# Altium integrated library CbyP.IntLib: 1144 symbols (part 5 of 6) (continued)
## STM32F411RET6 (continued)
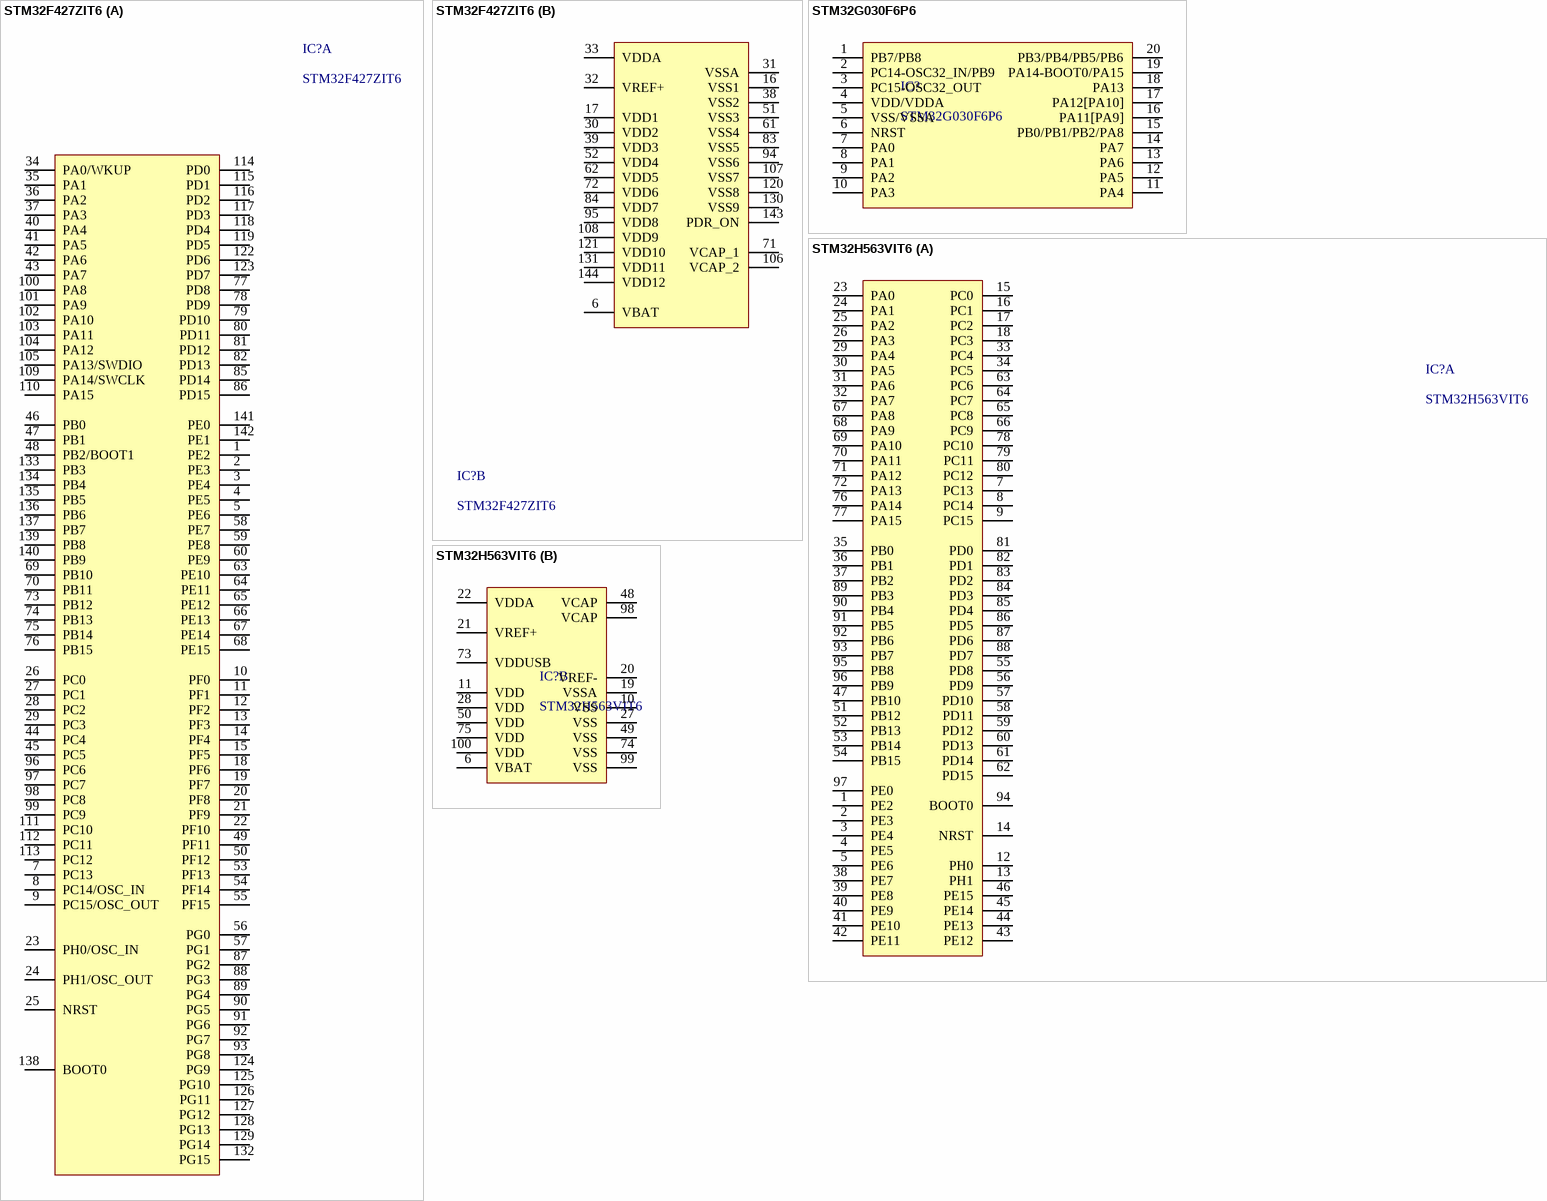
[diagram p32: symbols STM32F427ZIT6 to STM32H563VIT6]

## STM32F427ZIT6
designator IC?
2MB 1.8V~3.6V ARM-M4 256KB 180MHz FLASH 114 LQFP-144(20x20) Microcontrollers (MCU/MPU/SOC) ROHS; Manufacturer: STMicroelectronics; So_Chan_Dan: 144; So_Chan_Cam: 0; Package: LQFP-64(10x10); Mfr.Part #: STM32F427ZIT6; Name: STM32F427ZIT6
footprint LQFP-144(20x20)
part A pins: 1 PE2, 2 PE3, 3 PE4, 4 PE5, 5 PE6, 7 PC13, 8 PC14/OSC_IN, 9 PC15/OSC_OUT, 10 PF0, 11 PF1, 12 PF2, 13 PF3, 14 PF4, 15 PF5, 18 PF6, 19 PF7, 20 PF8, 21 PF9, 22 PF10, 23 PH0/OSC_IN, 24 PH1/OSC_OUT, 25 NRST, 26 PC0, 27 PC1, 28 PC2, 29 PC3, 34 PA0/WKUP, 35 PA1, 36 PA2, 37 PA3, 40 PA4, 41 PA5, 42 PA6, 43 PA7, 44 PC4, 45 PC5, 46 PB0, 47 PB1, 48 PB2/BOOT1, 49 PF11, 50 PF12, 53 PF13, 54 PF14, 55 PF15, 56 PG0, 57 PG1, 58 PE7, 59 PE8, 60 PE9, 63 PE10, 64 PE11, 65 PE12, 66 PE13, 67 PE14, 68 PE15, 69 PB10, 70 PB11, 73 PB12, 74 PB13, 75 PB14, 76 PB15, 77 PD8, 78 PD9, 79 PD10, 80 PD11, 81 PD12, 82 PD13, 85 PD14, 86 PD15, 87 PG2, 88 PG3, 89 PG4, 90 PG5, 91 PG6, 92 PG7, 93 PG8, 96 PC6, 97 PC7, 98 PC8, 99 PC9, 100 PA8, 101 PA9, 102 PA10, 103 PA11, 104 PA12, 105 PA13/SWDIO, 109 PA14/SWCLK, 110 PA15, 111 PC10, 112 PC11, 113 PC12, 114 PD0, 115 PD1, 116 PD2, 117 PD3, 118 PD4, 119 PD5, 122 PD6, 123 PD7, 124 PG9, 125 PG10, 126 PG11, 127 PG12, 128 PG13, 129 PG14, 132 PG15, 133 PB3, 134 PB4, 135 PB5, 136 PB6, 137 PB7, 138 BOOT0, 139 PB8, 140 PB9, 141 PE0, 142 PE1
part B pins: 6 VBAT, 16 VSS1, 17 VDD1, 30 VDD2, 31 VSSA, 32 VREF+, 33 VDDA, 38 VSS2, 39 VDD3, 51 VSS3, 52 VDD4, 61 VSS4, 62 VDD5, 71 VCAP_1, 72 VDD6, 83 VSS5, 84 VDD7, 94 VSS6, 95 VDD8, 106 VCAP_2, 107 VSS7, 108 VDD9, 120 VSS8, 121 VDD10, 130 VSS9, 131 VDD11, 143 PDR_ON, 144 VDD12

## STM32G030F6P6
designator IC?
ARM-M0 64MHz 18 TSSOP-20 Microcontrollers ROHS; Manufacturer: ST; So_Chna_Cam: 0; Mfr.Part #: STM32G030F6P6; Package: TSSOP-20; LCSC Part #: C724040; DigiKey Part Number: 497-STM32G030F6P6-ND; Link: https://www.lcsc.com/product-detail/Audio-Amplifiers_Jiaxing-Heroic-Elec-Tech-HT6818_C130782.html
footprint QSOP-24
pins: 1 PB7/PB8, 2 PC14-OSC32_IN/PB9, 3 PC15-OSC32_OUT, 4 VDD/VDDA, 5 VSS/VSSA, 6 NRST, 7 PA0, 8 PA1, 9 PA2, 10 PA3, 11 PA4, 12 PA5, 13 PA6, 14 PA7, 15 PB0/PB1/PB2/PA8, 16 PA11[PA9], 17 PA12[PA10], 18 PA13, 19 PA14-BOOT0/PA15, 20 PB3/PB4/PB5/PB6

## STM32H563VIT6
designator IC?
LQFP-100(14x14) Microcontrollers RoHS; Manufacturer: ST; Mfr.Part #: STM32H563VIT6; Package: LQFP-100(14x14); LCSC Part #: C6937834; DigiKey Part Number: 497-STM32H563VIT6-ND
footprint LQFP-100(14x14)
part A pins: 1 PE2, 2 PE3, 3 PE4, 4 PE5, 5 PE6, 7 PC13, 8 PC14, 9 PC15, 12 PH0, 13 PH1, 14 NRST, 15 PC0, 16 PC1, 17 PC2, 18 PC3, 23 PA0, 24 PA1, 25 PA2, 26 PA3 (power), 29 PA4, 30 PA5, 31 PA6, 32 PA7, 33 PC4, 34 PC5, 35 PB0, 36 PB1, 37 PB2, 38 PE7, 39 PE8, 40 PE9, 41 PE10, 42 PE11, 43 PE12, 44 PE13, 45 PE14, 46 PE15, 47 PB10, 51 PB12, 52 PB13, 53 PB14, 54 PB15, 55 PD8, 56 PD9, 57 PD10, 58 PD11, 59 PD12, 60 PD13, 61 PD14, 62 PD15, 63 PC6, 64 PC7, 65 PC8, 66 PC9, 67 PA8, 68 PA9, 69 PA10, 70 PA11, 71 PA12, 72 PA13, 76 PA14, 77 PA15, 78 PC10, 79 PC11, 80 PC12, 81 PD0, 82 PD1, 83 PD2, 84 PD3, 85 PD4, 86 PD5, 87 PD6, 88 PD7, 89 PB3, 90 PB4, 91 PB5, 92 PB6, 93 PB7, 94 BOOT0, 95 PB8, 96 PB9, 97 PE0
part B pins: 6 VBAT (power), 10 VSS (power), 11 VDD (power), 19 VSSA (power), 20 VREF- (power), 21 VREF+ (power), 22 VDDA, 27 VSS (power), 28 VDD, 48 VCAP (power), 49 VSS (power), 50 VDD (power), 73 VDDUSB (power), 74 VSS (power), 75 VDD (power), 98 VCAP, 99 VSS (power), 100 VDD (power)

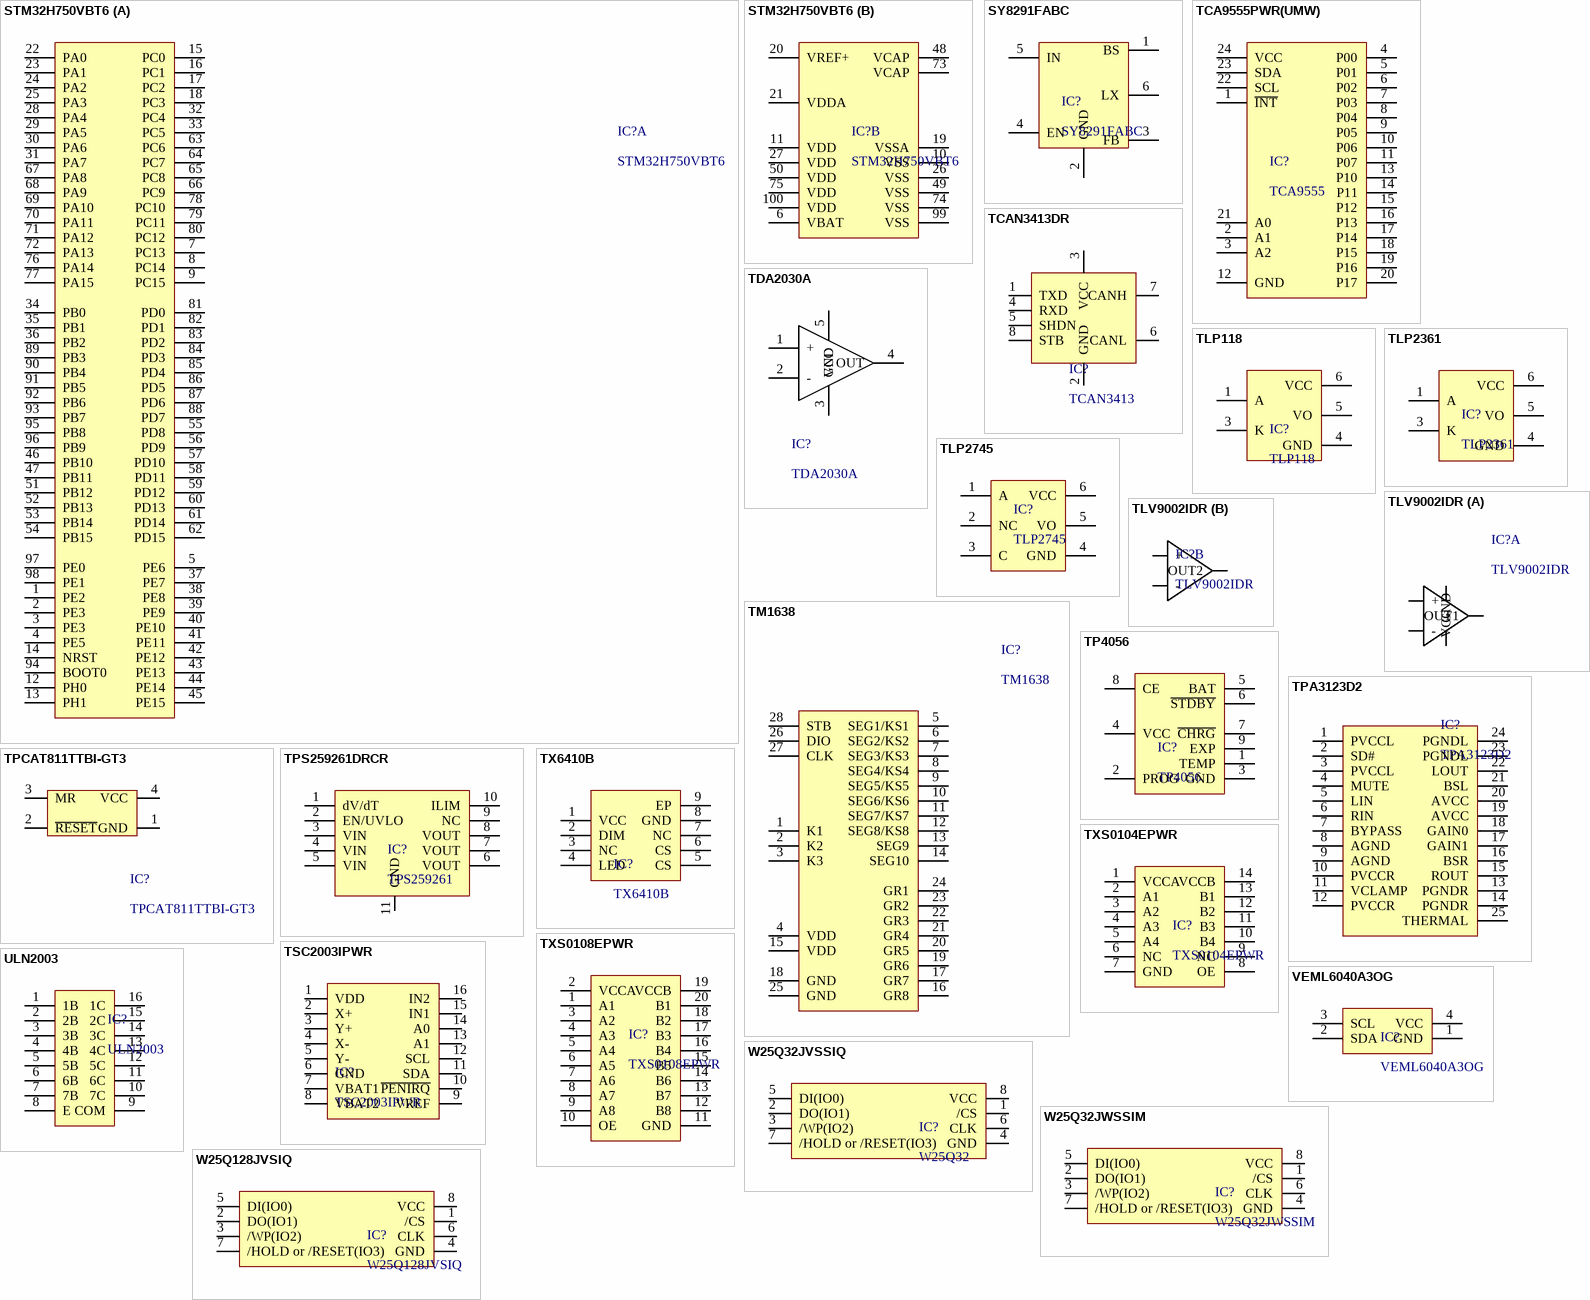
[diagram p33: symbols STM32H750VBT6 to W25Q128JVSIQ]

## STM32H750VBT6
designator IC?
ARM-MSeries LQFP-100(14x14) Microcontrollers (MCU/MPU/SOC) ROHS; Manufacturer: STMicroelectronics; So_Chan_Dan: 100; So_Chan_Cam: 0; Mfr.Part #: STM32H750VBT6; Package: LQFP-100(14x14); Name: STM32H750VBT6
footprint LQFP-100(14x14)
part A pins: 1 PE2, 2 PE3, 3 PE3, 4 PE5, 5 PE6, 7 PC13, 8 PC14, 9 PC15, 12 PH0, 13 PH1, 14 NRST, 15 PC0, 16 PC1, 17 PC2, 18 PC3, 22 PA0, 23 PA1, 24 PA2, 25 PA3, 28 PA4, 29 PA5, 30 PA6, 31 PA7, 32 PC4, 33 PC5, 34 PB0, 35 PB1, 36 PB2, 37 PE7, 38 PE8, 39 PE9, 40 PE10, 41 PE11, 42 PE12, 43 PE13, 44 PE14, 45 PE15, 46 PB10, 47 PB11, 51 PB12, 52 PB13, 53 PB14, 54 PB15, 55 PD8, 56 PD9, 57 PD10, 58 PD11, 59 PD12, 60 PD13, 61 PD14, 62 PD15, 63 PC6, 64 PC7, 65 PC8, 66 PC9, 67 PA8, 68 PA9, 69 PA10, 70 PA11, 71 PA12, 72 PA13, 76 PA14, 77 PA15, 78 PC10, 79 PC11, 80 PC12, 81 PD0, 82 PD1, 83 PD2, 84 PD3, 85 PD4, 86 PD5, 87 PD6, 88 PD7, 89 PB3, 90 PB4, 91 PB5, 92 PB6, 93 PB7, 94 BOOT0, 95 PB8, 96 PB9, 97 PE0, 98 PE1
part B pins: 6 VBAT (power), 10 VSS (power), 11 VDD (power), 19 VSSA (power), 20 VREF+ (power), 21 VDDA (power), 26 VSS (power), 27 VDD (power), 48 VCAP (power), 49 VSS (power), 50 VDD (power), 73 VCAP (power), 74 VSS (power), 75 VDD (power), 99 VSS (power), 100 VDD (power)

## SY8291FABC
designator IC?
Lithium-ion/Polymer 1 SOT23-6 Battery Management ROHS; Manufacturer: Silergy Corp; So_Chan_Dan: 6; So_Chan_Cam: 0; Package: SOT23-6; Name: SY8291FABC; Mfr.Part #: SY8291FABC
footprint SOT23-6
pins: 1 BS, 2 GND, 3 FB (power), 4 EN (power), 5 IN (power), 6 LX

## TCA9555PWR(UMW)
designator IC?, comment TCA9555
16 I2C TSSOP-24 I/O Expanders RoHS; Manufacturer: UMW; Mfr.Part #: TCA9555PWR(UMW); Package: TSSOP-24; LCSC Part #: C42420608; DigiKey Part Number: NO; ComponentLink1Description: Link; ComponentLink1URL: https://www.lcsc.com/product-detail/C42420608.html?s_z=n_TCA9555PWR%28UMW%29; ComponentLink2Description: Link 1
footprint TSSOP-24
pins: 1 ~{INT}, 2 A1, 3 A2, 4 P00, 5 P01, 6 P02, 7 P03, 8 P04, 9 P05, 10 P06, 11 P07, 12 GND, 13 P10, 14 P11, 15 P12, 16 P13, 17 P14, 18 P15, 19 P16, 20 P17, 21 A0, 22 SCL, 23 SDA, 24 VCC

## TCAN3413DR
designator IC?, comment TCAN3413
5Mbps CAN FD Transceiver SOIC-8 CAN Transceivers ROHS; Manufacturer: Texas Instruments; Mfr.Part #: TCAN3413DR; Package: SOIC-8; LCSC Part #: C22433320
footprint SOIC-8
pins: 1 TXD, 2 GND, 3 VCC "VH/RH", 4 RXD, 5 SHDN, 6 CANL, 7 CANH, 8 STB

## TDA2030A
designator IC?
Monaural 12Wx1@8Ω AB Class Amplifier TO-220B Audio Amplifiers ROHS; Manufacturer: UTC(Unisonic Tech); Mfr.Part #: TDA2030AL-TB5-T; So_Chan_Dan: 0; So_Chan_Cam: 5; Package: FZIP5; Name: TDA2030A
footprint FZIP5
pins: 1 +, 2 -, 3 GND, 4 OUT, 5 VCC

## TLP118
designator IC?
60ns 4.5V~5.5V 15kV/us DC SO-5-4.6mm Logic Output Optocoupler ROHS
footprint SO-5
pins: 1 A, 3 K, 4 GND, 5 VO, 6 VCC

## TLP2361
designator IC?
15Mbit/s 80ns 2.7V~5.5V 20kV/us DC SO-5 Logic Output Optocoupler ROHS
footprint SO-5
pins: 1 A, 3 K, 4 GND, 5 VO, 6 VCC

## TLP2745
designator IC?
120ns 4.5V~30V 30kV/us DC SOIC-6-300mil Logic Output Optoisolators ROHS; Manufacturer: TOSHIBA; Mfr.Part #: TLP2745(TP,E; So_Chan_Cam: 0; So_Chan_Dan: 6; Package: SOIC-6-300mil; Name: TLP2745
footprint SOIC-6-300mil
pins: 1 A, 2 NC, 3 C, 4 GND, 5 VO, 6 VCC

## TLV9002IDR
designator IC?
Low-Power, RRIO, 1-MHz Operational Amplifier for Cost-Sensitive Systems; Manufacturer: TI; Package: SOIC-8; Mfr.Part #: TLV9002IDR; LCSC Part #: C398360
footprint SOIC-8
part A pins: 1 OUT1, 2 -, 3 +, 4 GND (power), 8 VCC (power)
part B pins: 5 +, 6 -, 7 OUT2

## TM1638
designator IC?
4.5V~5.5V 1MHz 20mA 80mA SOIC-28-300mil Display Drivers RoHS; Manufacturer: TM(Shenzhen Titan Micro Elec); Package: SOIC-28-300mil; Mfr.Part #: TM1638; LCSC Part #: C19187; DigiKey Part Number: NO
footprint SOIC-28-300mil
pins: 1 K1, 2 K2, 3 K3, 4 VDD, 5 SEG1/KS1, 6 SEG2/KS2, 7 SEG3/KS3, 8 SEG4/KS4, 9 SEG5/KS5, 10 SEG6/KS6, 11 SEG7/KS7, 12 SEG8/KS8, 13 SEG9, 14 SEG10, 15 VDD, 16 GR8, 17 GR7 (power), 18 GND (power), 19 GR6 (power), 20 GR5, 21 GR4, 22 GR3 (power), 23 GR2, 24 GR1, 25 GND (power), 26 DIO (power), 27 CLK (power), 28 STB (power)

## TP4056
designator IC?
Lithium-ion/Polymer ESOP-8; Manufacturer: TPOWER; Package: ESOP-8; LCSC Part #: C382139; Mfr.Part #: TP4056; DigiKey Part Number: NO
footprint ESOP-8
pins: 1 TEMP, 2 PROG, 3 GND (power), 4 VCC (power), 5 BAT (power), 6 ~{STDBY}, 7 ~{CHRG}, 8 CE, 9 EXP

## TPA3123D2
designator IC?
Dual Channel 25Wx2@4Ω Class D Amplifier TSSOP-24-EP Audio Amplifiers ROHS; Manufacturer: Texas Instruments; Mft.Part #: TPA3123D2PWPR; So_Chan_Dan: 25; So_Chan_Cam: 0; Package: TSSOP-24-EP; Name: TPA3123D2
footprint TSSOP-24-EP
pins: 1 PVCCL, 2 SD#, 3 PVCCL, 4 MUTE, 5 LIN, 6 RIN, 7 BYPASS (power), 8 AGND, 9 AGND (power), 10 PVCCR, 11 VCLAMP, 12 PVCCR, 13 PGNDR, 14 PGNDR, 15 ROUT, 16 BSR, 17 GAIN1 (power), 18 GAIN0 (power), 19 AVCC (power), 20 AVCC, 21 BSL, 22 LOUT (power), 23 PGNDL, 24 PGNDL, 25 THERMAL (power)

## TPCAT811TTBI-GT3
designator IC?
140ms Active Low 1.2V~5.5V 1 SOT-143 Supervisor and Reset ICs ROHS; Manufacturer: TECH PUBLIC; Mfr.Part #: TPCAT811TTBI-GT3; LCSC Part #: C42449022; Package: SOT-143; DigiKey Part Number: NO; ComponentLink1Description: Link; ComponentLink1URL: https://www.lcsc.com/product-detail/C42449022.html?s_z=n_TPCAT811TTBI-GT3; ComponentLink2Description: Link 1; ComponentLink2URL: *
footprint SOT-143
pins: 1 GND, 2 ~{RESET}, 3 MR, 4 VCC

## TPS259261DRCR
designator IC?, comment TPS259261
5A Active High VSON-10-EP(3x3) Current Regulation/Management RoHS; Manufacturer: TI; Mfr.Part #: TPS259261DRCR; Package: VSON-10-EP(3x3); DigiKey Part Number: 296-47235-2-ND; LCSC Part #: C182419; ComponentLink1Description: Link; ComponentLink1URL: https://www.lcsc.com/product-detail/C182419.html?s_z=n_TPS259261DRCR; ComponentLink2Description: Link 1; ComponentLink2URL: https://www.digikey.com/en/products/detail/texas-instruments/TPS259261DRCR/5481852?s=N4IgTCBcDa4JwDYC0AWA7GAzAViWJAcgCIgC6AvkA
footprint TDFN-10-EP(3x3)
pins: 1 dV/dT, 2 EN/UVLO, 3 VIN, 4 VIN, 5 VIN, 6 VOUT, 7 VOUT, 8 VOUT, 9 NC, 10 ILIM, 11 GND

## TSC2003IPWR
designator IC?
12 2.5V~5.25V I2C TSSOP-16 Touch Screen Controllers RoHS; Manufacturer: TI; Mfr.Part #: TSC2003IPWR; Package: TSSOP-16; LCSC Part #: C34467; DigiKey Part Number: 296-14340-2-ND
footprint TSSOP-16
pins: 1 VDD, 2 X+, 3 Y+, 4 X-, 5 Y-, 6 GND, 7 VBAT1, 8 VBAT2, 9 VREF, 10 ~{PENIRQ}, 11 SDA, 12 SCL, 13 A1, 14 A0, 15 IN1, 16 IN2

## TX6410B
designator IC?
2.5V~30V PWM 1 2A 2.5V~30V ESOP-8 LED Drivers ROHS; Manufacturer: XDS; So_Chan_Dan: 9; So_Chan_Cam: 0; ComponentLink1Description: New link; ComponentLink1URL: https://www.lcsc.com/product-detail/LED-Drivers_XDS-TX6410B_C524847.html; Mfr.Part #: TX6410B; Package: ESOP-8; Name: TX6410B
footprint ESOP-8
pins: 1 VCC, 2 DIM, 3 NC, 4 LED, 5 CS, 6 CS, 7 NC, 8 GND, 9 EP

## TXS0104EPWR
designator IC?
4-Bit Bidirectional Voltage-Level Translator For Open-Drain and Push-Pull Applications; Manufacturer: TI; Mfr.Part #: TXS0104EPWR; Package: TSSOP-14; LCSC Part #: C44955
footprint TSSOP-14
pins: 1 VCCA, 2 A1, 3 A2, 4 A3, 5 A4, 6 NC, 7 GND, 8 OE, 9 NC, 10 B4, 11 B3, 12 B2, 13 B1, 14 VCCB

## TXS0108EPWR
designator IC?
60Mbps 1 8 TSSOP-20 Translators, Level Shifters RoHS; Manufacturer: TI; Mfr.Part #: TXS0108EPWR; Package: TSSOP-20; LCSC Part #: C17206; DigiKey Part Number: 296-23011-2-ND; ComponentLink1Description: Link; ComponentLink1URL: https://www.lcsc.com/product-detail/C17206.html?s_z=n_TXS0108EPWR; ComponentLink2Description: Link 1; ComponentLink2URL: https://www.digikey.com/en/products/detail/texas-instruments/TXS0108EPWR/1775302
footprint TSSOP-20
pins: 1 A1, 2 VCCA, 3 A2, 4 A3, 5 A4, 6 A5, 7 A6, 8 A7, 9 A8, 10 OE, 11 GND, 12 B8, 13 B7, 14 B6, 15 B5, 16 B4, 17 B3, 18 B2, 19 VCCB, 20 B1

## ULN2003
designator IC?
7 50V 500mA SOIC-16 Bipolar Transistor Arrays ROHS; Manufacturer: TI; Mfr.Part #: ULN2003BDR; Package: SOIC-16; LCSC Part #: C157485
footprint SOIC-16
pins: 1 1B, 2 2B, 3 3B, 4 4B, 5 5B, 6 6B, 7 7B, 8 E, 9 COM, 10 7C, 11 6C, 12 5C, 13 4C, 14 3C, 15 2C, 16 1C

## VEML6040A3OG
designator IC?
I2C Red,Green,Blue,White OPLGA-4(1.3x2) Ambient Light Sensors ROHS; Manufacturer: Vishay Intertech; So_Chan_Dan: 4; So_Chan_Cam: 0; Package: OPLGA-4(1.3x2); Name: VEML6040A3OG; Mfr.Part #: VEML6040A3OG
footprint OPLGA-4(1.3x2)
pins: 1 GND, 2 SDA, 3 SCL (power), 4 VCC (power)

## W25Q32JVSSIQ
designator IC?, comment W25Q32
SPI Flash 32M-BIT Serial Flash Memory with Dual, Quad SPI; Manufacturer: Winbond; Mfr.Part #: W25Q32JVSSIQ; Package: SOIC-8-208mil; LCSC Part #: C179173
footprint SOIC-8-208mil
pins: 1 /CS, 2 DO(IO1), 3 /WP(IO2), 4 GND, 5 DI(IO0), 6 CLK, 7 /HOLD or /RESET(IO3), 8 VCC

## W25Q32JWSSIM
designator IC?
32Mbit 1.7V~1.95V 133MHz SPI SOIC-8-208mil Memory (ICs) RoHS; Manufacturer: Winbond; Package: SOIC-8-208mil; Mfr.Part #: W25Q32JWSSIM; LCSC Part #: C7117009; DigiKey Part Number: 256-W25Q32JWSSIM-ND
footprint SOIC-8-208mil
pins: 1 /CS, 2 DO(IO1), 3 /WP(IO2), 4 GND, 5 DI(IO0), 6 CLK, 7 /HOLD or /RESET(IO3), 8 VCC

## W25Q128JVSIQ
designator IC?
128Mbit 2.7V~3.6V 133MHz SPI SOIC-8-208mil Memory (ICs) RoHS; Manufacturer: Winbond; Package: SOIC-8-208mil; Mfr.Part #: W25Q128JVSIQ; LCSC Part #: C97521; DigiKey Part Number: W25Q128JVSIQ-ND
footprint SOIC-8-208mil
pins: 1 /CS, 2 DO(IO1), 3 /WP(IO2), 4 GND, 5 DI(IO0), 6 CLK, 7 /HOLD or /RESET(IO3), 8 VCC

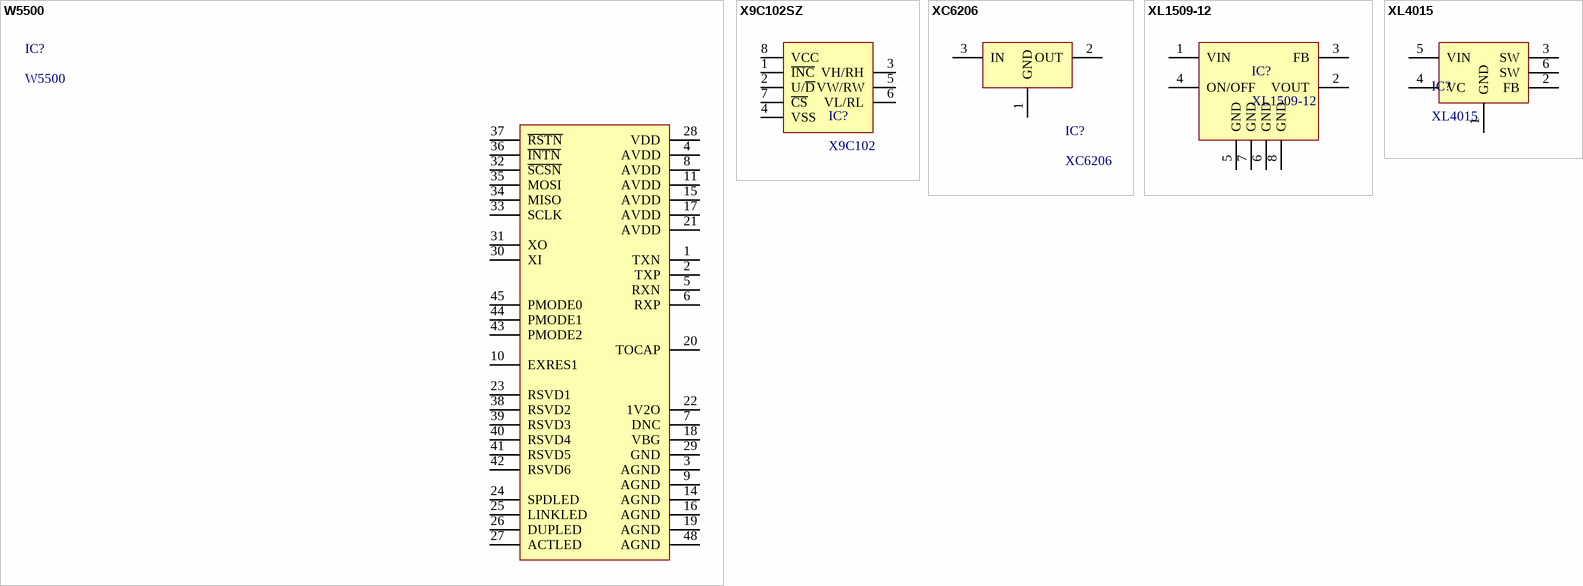
[diagram p34: symbols W5500 to XL4015]

## W5500
designator IC?
Hardwired TCP/IP embedded Ethernet controller; Manufacturer: WIZNET; Mfr.Part #: W5500; Package: LQFP-48(7x7); LCSC Part #: C32843; DigiKey Part Number: 1278-W5500TR-ND
footprint LQFP-48(7x7)
pins: 1 TXN, 2 TXP, 3 AGND, 4 AVDD, 5 RXN, 6 RXP, 7 DNC, 8 AVDD, 9 AGND, 10 EXRES1, 11 AVDD, 14 AGND, 15 AVDD, 16 AGND, 17 AVDD, 18 VBG, 19 AGND, 20 TOCAP, 21 AVDD, 22 1V2O, 23 RSVD1, 24 SPDLED, 25 LINKLED, 26 DUPLED, 27 ACTLED, 28 VDD, 29 GND, 30 XI, 31 XO, 32 ~{SCSN}, 33 SCLK, 34 MISO, 35 MOSI, 36 ~{INTN}, 37 ~{RSTN}, 38 RSVD2, 39 RSVD3, 40 RSVD4, 41 RSVD5, 42 RSVD6, 43 PMODE2, 44 PMODE1, 45 PMODE0, 48 AGND

## X9C102SZ
designator IC?, comment X9C102
±20% 4.5V~5.5V 1kΩ SOIC-8-150mil Digital Potentiometers ROHS; Manufacturer: RENESAS; Mfr.Part #: X9C102SZ; Package: SOIC-8-150mil; LCSC Part #: C1520914
footprint SOIC-8
pins: 1 ~{INC}, 2 U/~{D}, 3 VH/RH, 4 VSS, 5 VW/RW, 6 VL/RL, 7 ~{CS}, 8 VCC

## XC6206
designator IC?
40dB@(1kHz) 250mA Fixed 2.8V Positive electrode 8V SOT-23 Voltage Regulators - Linear, Low Drop Out (LDO) Regulators ROHS; Manufacturer: UMW(Youtai Semiconductor Co., Ltd.); Mfr.Part #: XC6206P282MR; So_Chan_Dan: 3; So_Chan_Cam: 0; Name: XC6206; ComponentLink1Description: New link; ComponentLink1URL: https://www.lcsc.com/product-detail/Voltage-Regulators-Linear-Low-Drop-Out-LDO-Regulators_UMW-Youtai-Semiconductor-Co-Ltd-XC6206P282MR_C347374.html; Package: SOT-23
footprint SOT-23
pins: 1 GND, 2 OUT, 3 IN

## XL1509-12
designator IC?
SOIC-8 DC-DC Converters ROHS
footprint SOIC-8
pins: 1 VIN, 2 VOUT, 3 FB, 4 ON/OFF, 5 GND, 6 GND, 7 GND, 8 GND

## XL4015
designator IC?
Step-down type TO-263-5 DC-DC Converters ROHS; Manufactuerer: XLSEMI; Mfr.Part #: XL4015E1; So_Chan_Dan: 6; So_Chan_Cam: 0; Package: TO-263-5; Name: XL4015
footprint TO-263-5L
pins: 1 GND, 2 FB, 3 SW, 4 VC, 5 VIN, 6 SW


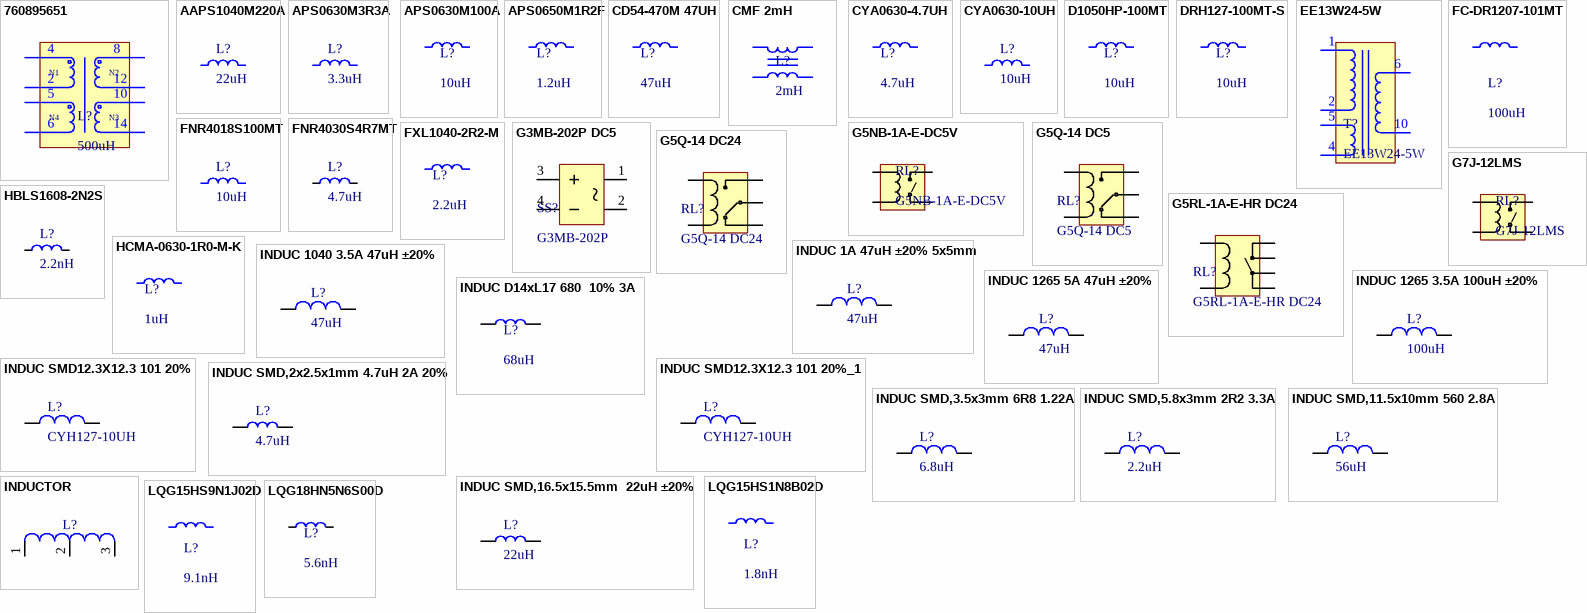
[diagram p35: symbols 760895651 to LQG18HN5N6S00D]

## 760895651
designator L?, comment 500uH
Resonant Converters For For AC/DC Converters SMPS Transformer 4000Vrms Isolation 70 ~ 120kHz Through Hole; Manufacturer: Würth Elektronik; Mfr.Part #: 760895651; Package: Through Hole,43x44mm; LCSC Part #: NO; DigiKey Part Number: 732-5067-ND; ComponentLink1Description: Link 1; ComponentLink1URL: https://www.digikey.com/en/products/detail/w%C3%BCrth-elektronik/760895651/4692729?s=N4IgTCBcDaIOwDYAMAOAnAVgRgjCAugL5A
footprint Through Hole,43x44mm
pins: 2, 4, 5, 6, 8, 10, 12, 14
text: N1; N2; N4; N3

## AAPS1040M220A
designator L?, comment 22uH
5.05A 22uH 65.3mΩ 5.55A ±20% SMD,11.5x10mm Fixed Inductors RoHS; Manufacturer: Coilank; Mfr.Part #: AAPS1040M220A; Package: SMD,11.5x10mm; LCSC Part #: C47327362; DigiKey Part Number: NO; ComponentLink1Description: Link; ComponentLink1URL: https://www.lcsc.com/product-detail/C47327362.html; ComponentLink2Description: Link 1
footprint SMD,11.5x10mm-(1040)
pins: 1, 2

## APS0630M3R3A
designator L?, comment 3.3uH
FIXED IND 3.3uH SMD,7.7x6.6mm; Manufacturer: Coilank; Mfr.Part #: APS0630M3R3A; Package: SMD,7.7x6.6mm; LCSC Part #: C47327202
footprint 0630,SMD,7.7x6.6x3mm
pins: 1, 2

## APS0630M100A
designator L?, comment 10uH
4.55A 10uH ±20% 66.3mΩ 5.55A SMD,7.7x6.6mm Fixed Inductors RoHS; Manufacturer: Coilank; Mfr.Part #: APS0630M100A; Package: SMD,7.7x6.6mm; LCSC Part #: C47149121; DigiKey Part Number: NO; ComponentLink1Description: Link; ComponentLink1URL: https://www.lcsc.com/product-detail/C47327207.html?s_z=n_q_C47327207; ComponentLink2Description: Link 1
footprint 0630,SMD,7.7x6.6x3mm
pins: 1, 2

## APS0650M1R2F
designator L?, comment 1.2uH
18A 1.2uH ±20% 5.83mΩ 16A SMD,6.6x6.4mm Fixed Inductors RoHS; Manufacturer: APS0650M1R2F; Mfr.Part #: APS0650M1R2F; Package: SMD,6.6x6.4mm; LCSC Part #: C49261287
footprint SMD,6.6x6.4x5mm
pins: 1, 2

## CD54-470M 47UH
designator L?, comment 47uH
720mA 47uH ±20% 370mΩ Unshielded Inductor SMD,5.8x5.2mm Fixed Inductors RoHS; Manufacturer: DMBJ; Mfr.Part #: CD54-470M 47UH; Package: SMD,5.8x5.2mm; LCSC Part #: C2826666
footprint CD54 (SMD,5.8x5.2mm)
pins: 1, 2

## CMF 2mH
designator L?, comment 2mH
2mH 2 DIP-4P,21x12.5mm Common Mode Filters ROHS; Manufacturer: XR; Mfr.Part #: XRT16128B-202VFR1L; Name: INDUC 0603 10uH 90mA 20%; So_Chan_Cam: 4; Package: DIP-4P,21x12.5mm
footprint DIP-4P,21x12.5mm
pins: 1, 2, 3, 4

## CYA0630-4.7UH
designator L?, comment 4.7uH
FIXED IND 4.7uH 5A 34.5mΩ SMD,7.2x6.6mm; Manufacturer: SHOU HAN; Mfr.Part #: CYA0630-4.7UH; Package: SMD,7.2x6.6mm; LCSC Part #: C5189748
footprint 0630,SMD,7x6.6x3mm
pins: 1, 2

## CYA0630-10UH
designator L?, comment 10uH
4A 10uH 5.5A 71mΩ ±20% SMD,7.2x6.6mm Fixed Inductors RoHS; Manufacturer: SHOU HAN; Mfr.Part #: CYA0630-10UH; Package: SMD,7.2x6.6mm; LCSC Part #: C5189958; DigiKey Part Number: NO; ComponentLink1Description: Link; ComponentLink1URL: https://www.lcsc.com/product-detail/C5189958.html?s_z=n_0630%252010u
footprint 0630,SMD,7x6.6x3mm
pins: 1, 2

## D1050HP-100MT
designator L?, comment 10uH
10uH Molded Inductor ±20% 7.5A SMD,11.6x10.1mm Power Inductors ROHS; Manufacturer: DEYAN; Mfr.Part #: D1050HP-100MT; Package: SMD,11.6x10.1mm; LCSC Part #: C41410648
footprint SMD,11.6x10.1mm
pins: 1, 2

## DRH127-100MT-S
designator L?, comment 10uH
6A 10uH 27mΩ 9A Magnetic Shielded Inductor ±20% SMD,12.5x12.5mm Fixed Inductors RoHS; Manufacturer: DEYAN; Mfr.Part #: DRH127-100MT-S; Package: SMD,12.5x12.5mm; LCSC Part #: C41410710; DigiKey Part Number: NO
footprint SMD,12.5x12.5x8mm
pins: 1, 2

## EE13W24-5W
designator T?
Mfr.Part #: EE13W24-5W; Package: Through Hole; ComponentLink1Description: Link; ComponentLink1URL: https://item.taobao.com/item.htm?abbucket=14&id=989563889080&mi_id=00006vOlkxsS1s_bjXIfYvpzNSyGkA15-pYH7-gxmzQmgR4&ns=1&priceTId=2100c88c17831359518761158e0c22&skuId=6197651939356&spm=a21n57.1.hoverItem.11&utparam=%7B%22aplus_abtest%22%3A%22a56ad2aacb5b2d99433eb34ad0ee5c57%22%7D&xxc=taobaoSearch
footprint EE13WB
pins: 1, 2, 4, 5, 6, 10

## FC-DR1207-101MT
designator L?, comment 100uH
3A 100uH ±20% 175mΩ 3.5A SMD,12.5x12.5mm Fixed Inductors RoHS; Manufacturer: FANGCHENG; Mfr.Part #: FC-DR1207-101MT; LCSC Part #: C5368704; Package: SMD,12.5x12.5mm; DigiKey Part Number: NO; ComponentLink1Description: Link; ComponentLink1URL: https://www.lcsc.com/product-detail/C5368704.html?s_z=n_FC-DR1207-101MT; ComponentLink2Description: Link 1
footprint SMD,12.5x12.5x8mm
pins: 1, 2

## FNR4018S100MT
designator L?, comment 10uH
1.2A 10uH Magnetic Shielded Inductor ±20% 1.6A 234mΩ SMD,4x4mm Fixed Inductors RoHS; Manufacturer: cjiang; Mfr.Part #: FNR4018S100MT; Package: SMD,4x4mm; LCSC Part #: C167808; DigiKey Part Number: NO
footprint SMD,4x4x1.8mm(4018)
pins: 1, 2

## FNR4030S4R7MT
designator L?, comment 4.7uH
2.3A 4.7uH Shielded Power Inductor ±20% 3.2A SMD,4x4mm Power Inductors ROHS; Manufacturer: Me-TECHcjiang (Changjiang Microelectronics Tech); Mfr.Part #: FNR4030S4R7MT; Package: SMD,4x4mm
footprint SMD,4x4mm
pins: 1, 2

## FXL1040-2R2-M
designator L?, comment 2.2uH
FIXED IND 2.2uH 12A 7mΩ SMD,11.5x10mm; Manufacturer: cjiang; Mfr.Part #: FXL1040-2R2-M; Package: SMD,11.5x10mm; LCSC Part #: C167228
footprint SMD,11.5x10mm-(1040)
pins: 1, 2

## G3MB-202P DC5
designator SS?, comment G3MB-202P
Solid State Relays - PCB Mount SOLID STATE RELAY; Manufacturer: Omron Automation and Safety; Mfr.Part #: G3MB-202P DC5; Package: Plugin; Name: G3MB-202P DC5
footprint G3MB-202P
pins: 1 ~, 2 ~, 3 +, 4 _

## G5NB-1A-E-DC5V
designator RL?
5V 1 Set Normally Open: 1A (SPST NO) Through Hole,20.4x7mm Power Relays RoHS; Manufacturer: OMRON; LCSC Part #: C48746; Mfr.Part #: G5NB-1A-E-DC5V; DigiKey Part Number: NO; Package: Through Hole,20.4x7mm
footprint Plugin,7.2x20.5mm
pins: 1, 2 100, 3, 4

## G5Q-14 DC5
designator RL?
Miniature power relay, with 1-pole 10A switching capability; Manufacturer: OMRON; Mfr.Part #: G5Q-14 DC5; LCSC Part #: C397241; Package: Through Hole,20x10mm
footprint Through Hole,20x10mm
pins: 1, 2 COM, 3 NO, 4 NC, 5

## G5Q-14 DC24
designator RL?
Miniature power relay, with 1-pole 10A switching capability; Manufacturer: OMRON; Mfr.Part #: G5Q-14 DC24; LCSC Part #: C397242; Package: Through Hole,20x10mm
footprint Through Hole,20x10mm
pins: 1, 2, 3, 4, 5

## G5RL-1A-E-HR DC24
designator RL?
Low Profile Relay; Manufacturer: OMRON; Mfr.Part #: G5RL-1A-E-HR DC24; LCSC Part #: C397236; Package: DIP
footprint Through Hole,29x12.7mm
pins: 1, 3 COM, 4 NO, 5 NO, 6 COM, 8

## G7J-12LMS
designator RL?
Plugin,7.2x20.5mm Power Relays ROHS; Manufacturer: STEIPU; So_Chan_Cam: 4; So_Chan_Dan: 0; Name: G7J-12LMS; Mfr.Part #: G7J-12LMS; Package: Plugin,7.2x20.5mm
footprint Plugin,7.2x20.5mm
pins: 1, 2 100, 3, 4

## HBLS1608-2N2S
designator L?, comment 2.2nH
500mA 2.2nH 100mΩ 0603 Inductors (SMD) ROHS; Manufacturer: HYHONGYEX; Mfr.Part #: HBLS1608-2N2S; Package: 0630
footprint INDUC-0603
pins: 1, 2

## HCMA-0630-1R0-M-K
designator L?, comment 1uH
11A 1uH ±20% 6.7mΩ 13.5A Molded Inductor SMD,7.3x6.6mm Fixed Inductors RoHS; Manufacturer: YOUCHI; Mfr.Part #: HCMA-0630-1R0-M-K; Package: SMD,7.3x6.6mm; LCSC Part #: C54431697
footprint SMD,7.3x6.6x2.8mm
pins: 1, 2

## INDUC 1A 47uH ±20% 5x5mm
designator L?, comment 47uH
1A 47uH ±20% 1.1A SMD,5x5mm Power Inductors ROHS; Manufacturer: Sunlord; Mfr.Part #: SWPA5040S470MT; Name: INDUC 1A 47uH ±20% 5x5mm; So_Chan_Cam: 0; So_Chan_Dan: 2; Package: SMD,5x5mm
footprint SMD,5x5mm
pins: 1, 2

## INDUC 1040 3.5A 47uH ±20%
designator L?, comment 47uH
47uH Molding Choke ±20% 5A SMD,10.2x11mm Power Inductors ROHS; Manufacturer: DMBJ; Mfr.Part #: CXP1050-470M-AG(47uh); Name: INDUC 1040 3.5A 47uH ±20%; So_Chan_Cam: 0; So_Chan_Dan: 2; Package: SMD,10.2x11mm
footprint SMD,10.2x11mm-(1040)
pins: 1, 2

## INDUC 1265 3.5A 100uH ±20%
designator L?, comment 100uH
3.5A 100uH Integrated molded inductor ±20% 4A SMD,13.5x12.6mm Power Inductors ROHS; Manufacturer: Magnetsyc; Mfr.Part #: FSA1365-101MT; Name: INDUC 1265 3.5A 100uH ±20%; So_Chan_Cam: 0; So_Chan_Dan: 2; Package: SMD,13.5x12.6mm
footprint SMD,13.5x12.6mm-1265
pins: 1, 2

## INDUC 1265 5A 47uH ±20%
designator L?, comment 47uH
5A 47uH Molding Choke ±20% 5.5A SMD,13.5x12.6mm Power Inductors ROHS; Manufacturer: XR; Mfr.Part #: XR1265-470M; Name: INDUC 1040 3.5A 47uH ±20%; So_Chan_Cam: 0; So_Chan_Dan: 2; Package: SMD,13.5x12.6mm
footprint SMD,13.5x12.6mm-1265
pins: 1, 2

## INDUC D14xL17 680  10% 3A
designator L?, comment 68uH
68 µH Unshielded Inductor 3 A 68mOhm Max Radial, Vertical Cylinder; Manufacturer: TDK; Mfr.Part #: TSL1315S-680K3R0-PF; Name: INDUC D14xL17 680  10% 3A; So_Chan_Dan: 0; So_Chan_Cam: 2; Package: TSL1315
footprint TSL1315
pins: 1, 2

## INDUC SMD12.3X12.3 101 20%
designator L?, comment CYH127-10UH
5.4A 10uH ±20% 23.4mΩ SMD,12.3x12.3mm Inductors (SMD) ROHS; MF: Murata; MP: LQM18DN100M70B; Value: *; Price: None; Package: 0603 Murata; Check_prices: https://www.snapeda.com/parts/LQM18DN100M70B/Murata/view-part/4901244/?ref=eda; SnapEDA_Link: https://www.snapeda.com/parts/LQM18DN100M70B/Murata/view-part/4901244/?ref=snap; Availability: Bad
footprint SMD,12.3X12.3MM
pins: 1, 2

## INDUC SMD12.3X12.3 101 20%_1
designator L?, comment CYH127-10UH
5.4A 10uH ±20% 23.4mΩ SMD,12.3x12.3mm Inductors (SMD) ROHS; MF: Murata; MP: LQM18DN100M70B; Value: *; Price: None; Package: 0603 Murata; Check_prices: https://www.snapeda.com/parts/LQM18DN100M70B/Murata/view-part/4901244/?ref=eda; SnapEDA_Link: https://www.snapeda.com/parts/LQM18DN100M70B/Murata/view-part/4901244/?ref=snap; Availability: Bad
footprint SMD,12.3X12.3MM
pins: 1, 2

## INDUC SMD,2x2.5x1mm 4.7uH 2A 20%
designator L?, comment 4.7uH
2A 4.7uH Integrated molded inductor ±20% 2.6A SMD,2x2.5mm Power Inductors ROHS; Manufacturer: cjiang (Changjiang Microelectronics Tech); Mfr.Part #: FTC252010S4R7MBCA; Name: INDUC SMD,2x2.5x1mm 4.7uH 2A 20%; So_Chan_Dan: 2; So_Chan_Cam: 0; Package: SMD,2x2.5mm
footprint SMD,2x2.5x1mm
pins: 1, 2

## INDUC SMD,3.5x3mm 6R8 1.22A
designator L?, comment 6.8uH
1.22A 6.8uH ±20% SMD,3.5x3mm Power Inductors ROHS; Manufacturer: DMBJ; Mfr.Part #: CD32-6R8M 6.8UH; Name: INDUC SMD,5.8x5.2mm 470 720mA; So_Chan_Dan: 2; So_Chan_Cam: 0; Package: SMD,3.5x3mm
footprint CD32 (SMD,3.5x3mm)
pins: 1, 2

## INDUC SMD,5.8x3mm 2R2 3.3A
designator L?, comment 2.2uH
2.2uH ±30% 2220 Power Inductors ROHS; Manufacturer: GLE; Mfr.Part #: GCCD5830N-2R2N01; Name: INDUC SMD,5.8x3mm 2R2 3.3A; So_Chan_Dan: 2; So_Chan_Cam: 0; Package: SMD,5.8x3mm
footprint SMD,D5.8Xl3mm
pins: 1, 2